# Altium footprint library SAMTEC THD.PcbLib: 161 footprints (part 9 of 12)
Each footprint in its own frame and in the unit in brackets; x right, y up, seen from the top. Pads: shape width x height; smd on the part's side, far side on the other; paste and mask are expansions set on the pad; w line width, h text height; cw(c..) or ccw(c..) is an arc to the next point about the centre after c.
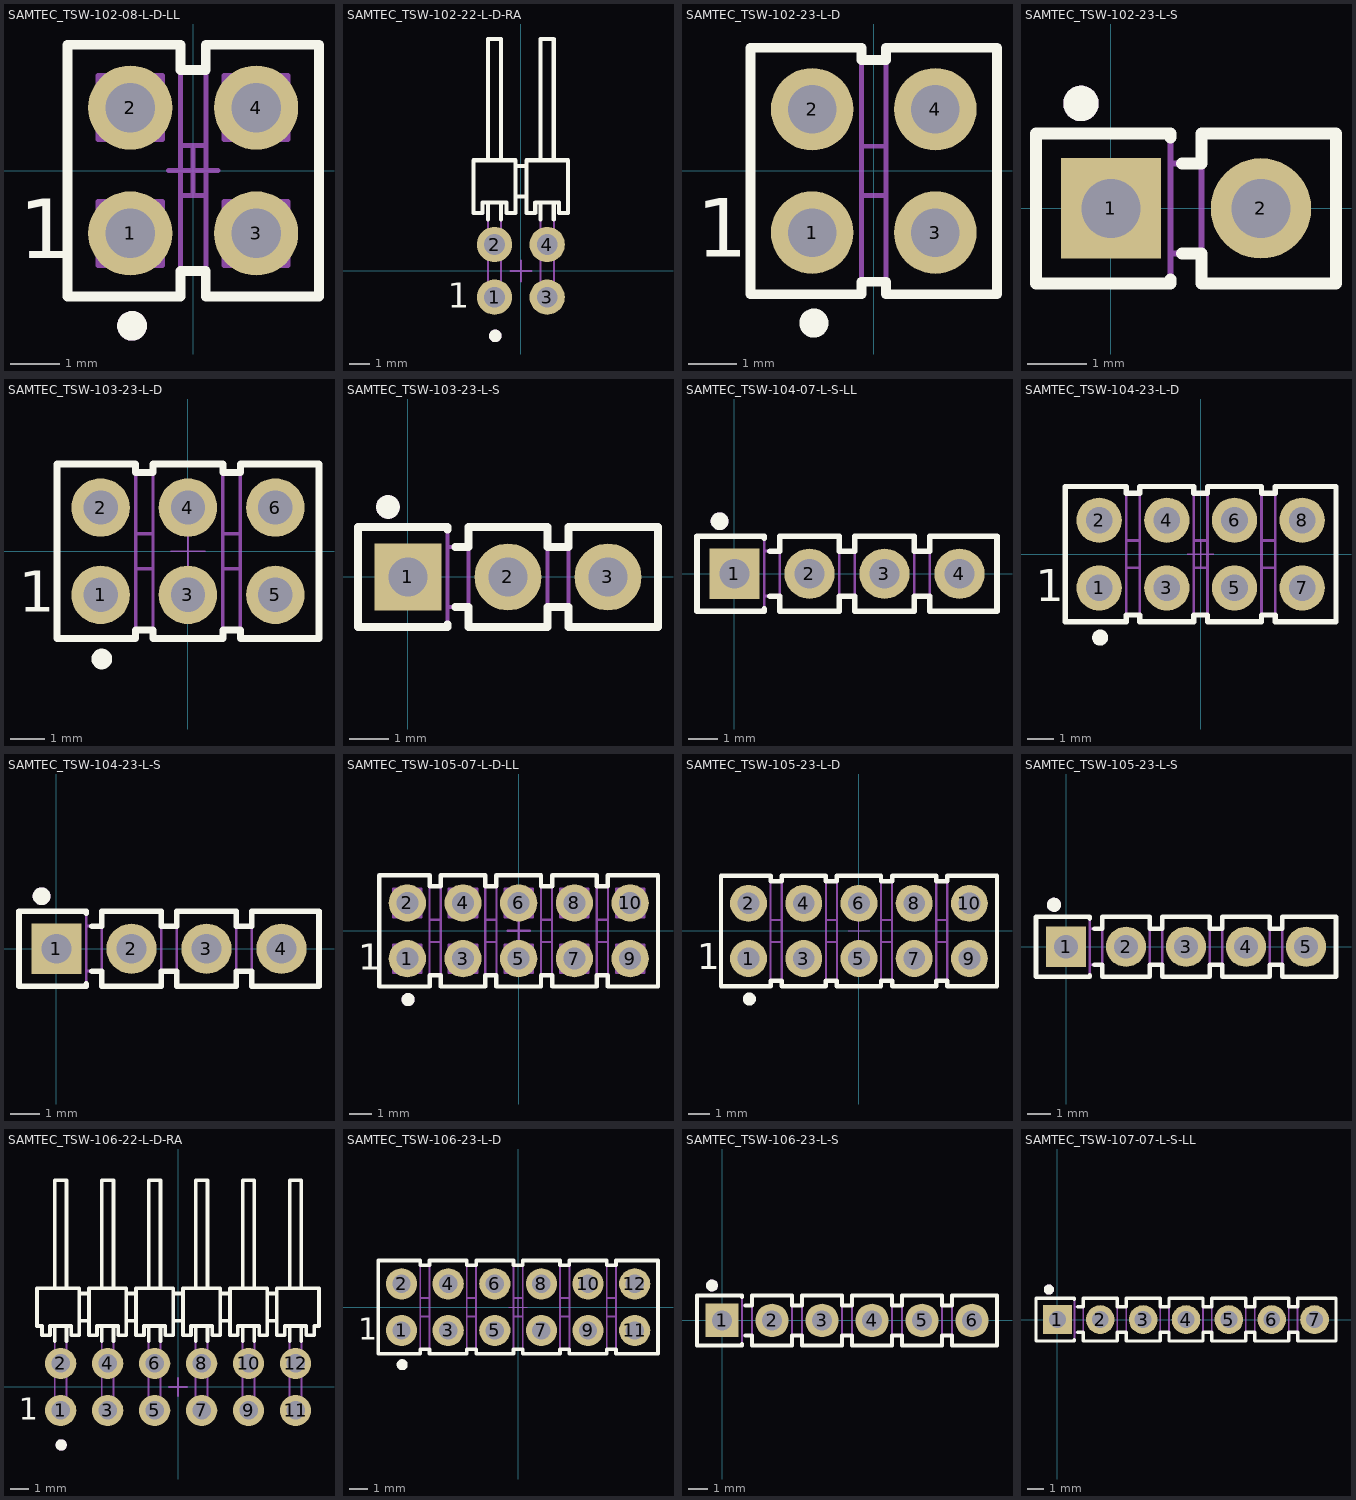
[diagram p8: the footprints below, top view; thin cyan lines are the x and y axes]

## SAMTEC_TSW-102-08-L-D-LL [mm] "4 Contacts, Pitch 2.54mm - Dual Row, Through Mount Straigh Header"
height 8.38
pads (4):
  round 1.7 hole 1: 1(-1.27,-1.27) 2(-1.27,1.27) 3(1.27,-1.27) 4(1.27,1.27)
Top Overlay:
  circle w0.3: c-1.235,-3.135 r0.15
  lines w0.2: 2.54,-2.54 2.54,2.54 ; 2.54,-2.54 0.254,-2.54 0.254,-2.032 -0.254,-2.032 -0.254,-2.54 -2.54,-2.54 -2.54,2.54 -0.254,2.54 -0.254,2.032 0.254,2.032 0.254,2.54 2.54,2.54 ; 2.54,-2.54 2.54,2.54
  text "1" at -3.517,-1.768 h1.2
Mechanical 8:
  lines w0.1: -1.77,-1.27 -1.27,-1.27 ; -1.77,1.27 -1.27,1.27 ; -1.27,-1.77 -1.27,-1.27 ; -1.27,-0.77 -1.27,-1.27 ; -1.27,0.77 -1.27,1.27 ; -1.27,1.77 -1.27,1.27 ; -0.77,-1.27 -1.27,-1.27 ; -0.77,1.27 -1.27,1.27 ; -0.5,0 0,0 ; 0,-0.5 0,0 ; 0,0.5 0,0 ; 0.5,0 0,0 ; 0.77,-1.27 1.27,-1.27 ; 0.77,1.27 1.27,1.27 ; 1.27,-1.77 1.27,-1.27 ; 1.27,-0.77 1.27,-1.27 ; 1.27,0.77 1.27,1.27 ; 1.27,1.77 1.27,1.27 ; 1.77,-1.27 1.27,-1.27 ; 1.77,1.27 1.27,1.27
Mechanical 14:
  circle w0.3: c-1.235,-3.135 r0.15
  lines w0.1: -0.254,-2.032 0.254,-2.032 ; -0.254,-0.508 0.254,-0.508 ; -0.254,0.508 0.254,0.508 ; -0.254,2.032 0.254,2.032 ; -2.54,-2.54 -0.254,-2.54 ; -2.54,-2.54 -2.54,2.54 ; -2.54,-2.54 -2.54,2.54 ; -2.54,2.54 -0.254,2.54 ; -1.918,-1.918 -0.622,-1.918 ; -1.918,-1.918 -1.918,-0.622 ; -1.918,-1.918 -1.587,-1.587 ; -1.918,-0.622 -0.622,-0.622 ; -1.918,-0.622 -1.587,-0.953 ; -1.918,0.622 -0.622,0.622 ; -1.918,0.622 -1.918,1.918 ; -1.918,0.622 -1.587,0.953 ; -1.918,1.918 -0.622,1.918 ; -1.918,1.918 -1.587,1.587 ; -1.587,-1.587 -0.953,-1.587 ; -1.587,-1.587 -1.587,-0.953 ; -1.587,-0.953 -0.953,-0.953 ; -1.587,0.953 -0.953,0.953 ; -1.587,0.953 -1.587,1.587 ; -1.587,1.587 -0.953,1.587 ; -0.953,-1.587 -0.953,-0.953 ; -0.953,-1.587 -0.622,-1.918 ; -0.953,-0.953 -0.622,-0.622 ; -0.953,0.953 -0.953,1.587 ; -0.953,0.953 -0.622,0.622 ; -0.953,1.587 -0.622,1.918 ; -0.622,-1.918 -0.622,-0.622 ; -0.622,0.622 -0.622,1.918 ; -0.254,-2.54 -0.254,2.54 ; -0.254,-2.54 -0.254,2.54 ; -0.254,-2.54 -0.254,2.54 ; 0.622,-1.918 1.918,-1.918 ; 0.622,-1.918 0.622,-0.622 ; 0.622,-1.918 0.953,-1.587 ; 0.622,-0.622 1.918,-0.622 ; 0.622,-0.622 0.953,-0.953 ; 0.622,0.622 1.918,0.622 ; 0.622,0.622 0.622,1.918 ; 0.622,0.622 0.953,0.953 ; 0.622,1.918 1.918,1.918 ; 0.622,1.918 0.953,1.587 ; 0.953,-1.587 1.587,-1.587 ; 0.953,-1.587 0.953,-0.953 ; 0.953,-0.953 1.587,-0.953 ; 0.953,0.953 1.587,0.953 ; 0.953,0.953 0.953,1.587 ; 0.953,1.587 1.587,1.587 ; 1.587,-1.587 1.587,-0.953 ; 1.587,-1.587 1.918,-1.918 ; 1.587,-0.953 1.918,-0.622 ; 1.587,0.953 1.587,1.587 ; 1.587,0.953 1.918,0.622 ; 1.587,1.587 1.918,1.918 ; 1.918,-1.918 1.918,-0.622 ; 1.918,0.622 1.918,1.918 ; 2.54,-2.54 2.54,2.54 ; 2.54,-2.54 0.254,-2.54 0.254,2.54 2.54,2.54 ; 2.54,-2.54 2.54,2.54
  text "1" at -3.517,-1.768 h1.2
3D body "SAMTEC_TSW-102-08-L-D-LL.stp": height 8.38, standoff -5.08, extent -2.54,-2.54 2.54,2.54

## SAMTEC_TSW-102-22-L-D-RA [mm] "4 Contacts - Pitch 2.54mm - Dual Row Through Mount  Right Angle Header (Post Lead 5.84mm, Tail Lead 4.84mm)"
height 5.56
pads (4):
  round 1.7 hole 1: 1(-1.27,-1.27) 2(-1.27,1.27) 3(1.27,-1.27) 4(1.27,1.27)
Top Overlay:
  circle w0.3: c-1.235,-3.135 r0.15
  lines w0.2: -1.587,2.479 -1.587,3.302 ; -1.587,5.334 -1.587,11.176 -0.952,11.176 -0.952,5.334 ; -0.952,2.479 -0.952,3.302 ; -0.264,3.581 0.264,3.581 ; -0.264,5.055 0.264,5.055 ; 0.953,2.479 0.953,3.302 ; 0.953,5.334 0.953,11.176 1.588,11.176 1.588,5.334 ; 1.588,2.479 1.588,3.302 ; -2.276,2.794 -1.844,2.794 -1.844,3.302 -0.696,3.302 -0.696,2.794 -0.264,2.794 -0.264,5.334 -2.276,5.334 -2.276,2.794 ; 0.264,2.794 0.696,2.794 0.696,3.302 1.844,3.302 1.844,2.794 2.276,2.794 2.276,5.334 0.264,5.334 0.264,2.794
  text "1" at -3.517,-1.768 h1.2
Mechanical 8:
  lines w0.1: -1.77,-1.27 -1.27,-1.27 ; -1.77,1.27 -1.27,1.27 ; -1.27,-1.77 -1.27,-1.27 ; -1.27,-0.77 -1.27,-1.27 ; -1.27,0.77 -1.27,1.27 ; -1.27,1.77 -1.27,1.27 ; -0.77,-1.27 -1.27,-1.27 ; -0.77,1.27 -1.27,1.27 ; -0.5,0 0,0 ; 0,-0.5 0,0 ; 0,0.5 0,0 ; 0.5,0 0,0 ; 0.77,-1.27 1.27,-1.27 ; 0.77,1.27 1.27,1.27 ; 1.27,-1.77 1.27,-1.27 ; 1.27,-0.77 1.27,-1.27 ; 1.27,0.77 1.27,1.27 ; 1.27,1.77 1.27,1.27 ; 1.77,-1.27 1.27,-1.27 ; 1.77,1.27 1.27,1.27
Mechanical 14:
  circle w0.3: c-1.235,-3.135 r0.15
  lines w0.1: -1.587,3.302 -1.587,-1.587 -0.952,-1.587 -0.952,3.302 ; -1.587,5.334 -1.587,11.176 -0.952,11.176 -0.952,5.334 ; -0.264,3.581 0.264,3.581 ; -0.264,5.055 0.264,5.055 ; 0.953,3.302 0.953,-1.587 1.588,-1.587 1.588,3.302 ; 0.953,5.334 0.953,11.176 1.588,11.176 1.588,5.334 ; -2.276,2.794 -1.844,2.794 -1.844,3.302 -0.696,3.302 -0.696,2.794 -0.264,2.794 -0.264,5.334 -2.276,5.334 -2.276,2.794 ; 0.264,2.794 0.696,2.794 0.696,3.302 1.844,3.302 1.844,2.794 2.276,2.794 2.276,5.334 0.264,5.334 0.264,2.794
  text "1" at -3.517,-1.768 h1.2
3D body "SAMTEC_TSW-102-22-L-D-RA.stp": height 5.59, standoff -4.83, extent -2.276,-1.587 2.276,11.176

## SAMTEC_TSW-102-23-L-D [mm] "4 Contacts - Pitch 2.54mm - Dual Row  Through Mount Straigh Header (Post Lead 5.84mm, Tail Lead 2.92mm, Insulator 2.54mm)"
height 8.38
pads (4):
  round 1.7 hole 1: 1(-1.27,-1.27) 2(-1.27,1.27) 3(1.27,-1.27) 4(1.27,1.27)
Top Overlay:
  circle w0.3: c-1.235,-3.135 r0.15
  lines w0.2: -2.54,-2.54 -2.54,2.54 -0.254,2.54 -0.254,2.286 0.254,2.286 0.254,2.54 2.54,2.54 2.54,-2.54 0.254,-2.54 0.254,-2.286 -0.254,-2.286 -0.254,-2.54 -2.54,-2.54
  text "1" at -3.642,-1.768 h1.2
Mechanical 8:
  lines w0.1: -1.77,-1.27 -1.27,-1.27 ; -1.77,1.27 -1.27,1.27 ; -1.27,-1.77 -1.27,-1.27 ; -1.27,-0.77 -1.27,-1.27 ; -1.27,0.77 -1.27,1.27 ; -1.27,1.77 -1.27,1.27 ; -0.77,-1.27 -1.27,-1.27 ; -0.77,1.27 -1.27,1.27 ; 0.77,-1.27 1.27,-1.27 ; 0.77,1.27 1.27,1.27 ; 1.27,-1.77 1.27,-1.27 ; 1.27,-0.77 1.27,-1.27 ; 1.27,0.77 1.27,1.27 ; 1.27,1.77 1.27,1.27 ; 1.77,-1.27 1.27,-1.27 ; 1.77,1.27 1.27,1.27
Mechanical 14:
  lines w0.1: -0.254,-2.286 0.254,-2.286 ; -0.254,-0.508 0.254,-0.508 ; -0.254,0.508 0.254,0.508 ; -0.254,2.286 0.254,2.286 ; -2.54,-2.54 -0.254,-2.54 -0.254,2.54 -2.54,2.54 -2.54,-2.54 ; -1.587,-1.588 -0.952,-1.588 -0.952,-0.953 -1.587,-0.953 -1.587,-1.588 ; -1.587,0.952 -0.952,0.952 -0.952,1.587 -1.587,1.587 -1.587,0.952 ; 0.254,-2.54 2.54,-2.54 2.54,2.54 0.254,2.54 0.254,-2.54 ; 0.953,-1.588 1.588,-1.588 1.588,-0.953 0.953,-0.953 0.953,-1.588 ; 0.953,0.952 1.588,0.952 1.588,1.587 0.953,1.587 0.953,0.952
3D body "SAMTEC_TSW-102-23-L-D.stp": height 8.38, standoff -2.92, extent -2.54,-2.54 2.54,2.54

## SAMTEC_TSW-102-23-L-S [mm] "2 Contacts - Pitch 2.54mm - Single Row  Through Mount Straigh Header (Post Lead 5.84mm, Tail Lead 2.92mm, Insulator 2.54mm)"
height 8.38
pads (2):
  rect 1.7x1.7 hole 1: 1(0,0)
  round 1.7 hole 1: 2(2.54,0)
Top Overlay:
  circle w0.3: c-0.508,1.778 r0.15
  lines w0.2: 1.007,-1.2 1.007,-1.27 -1.27,-1.27 -1.27,1.27 1.007,1.27 1.007,1.2 ; 1.2,-0.762 1.533,-0.762 1.533,-1.27 3.81,-1.27 3.81,1.27 1.533,1.27 1.533,0.762 1.2,0.762
Mechanical 8:
  lines w0.1: -0.5,0 0,0 ; 0,-0.5 0,0 ; 0,0.5 0,0 ; 0.5,0 0,0 ; 2.04,0 2.54,0 ; 2.54,-0.5 2.54,0 ; 2.54,0.5 2.54,0 ; 3.04,0 2.54,0
Mechanical 14:
  circle w0.3: c-0.508,1.778 r0.15
  lines w0.1: 1.007,-0.762 1.533,-0.762 ; 1.007,0.762 1.533,0.762 ; -1.27,-1.27 -1.27,1.27 1.007,1.27 1.007,-1.27 -1.27,-1.27 ; -0.317,-0.318 -0.317,0.317 0.317,0.317 0.318,-0.317 -0.317,-0.318 ; 1.533,-1.27 1.533,1.27 3.81,1.27 3.81,-1.27 1.533,-1.27 ; 2.223,-0.318 2.223,0.317 2.858,0.317 2.858,-0.318 2.223,-0.318
3D body "SAMTEC_TSW-102-23-L-S.stp": height 8.38, standoff -2.92, extent -1.27,-1.27 3.81,1.27

## SAMTEC_TSW-103-23-L-D [mm] "6 Contacts - Pitch 2.54mm - Dual Row  Through Mount Straigh Header (Post Lead 5.84mm, Tail Lead 2.92mm, Insulator 2.54mm)"
height 8.38
pads (6):
  round 1.7 hole 1: 1(-2.54,-1.27) 2(-2.54,1.27) 3(0,-1.27) 4(0,1.27) 5(2.54,-1.27) 6(2.54,1.27)
Top Overlay:
  circle w0.3: c-2.505,-3.135 r0.15
  lines w0.2: -3.81,-2.54 -1.524,-2.54 -1.524,-2.286 -1.016,-2.286 -1.016,-2.54 1.016,-2.54 1.016,-2.286 1.524,-2.286 1.524,-2.54 3.81,-2.54 3.81,2.54 1.524,2.54 1.524,2.286 1.016,2.286 1.016,2.54 -1.016,2.54 -1.016,2.286 -1.524,2.286 -1.524,2.54 -3.81,2.54 -3.81,-2.54
  text "1" at -4.912,-1.768 h1.2
Mechanical 8:
  lines w0.05: -3.04,-1.27 -2.54,-1.27 ; -3.04,1.27 -2.54,1.27 ; -2.54,-1.77 -2.54,-1.27 ; -2.54,-0.77 -2.54,-1.27 ; -2.54,0.77 -2.54,1.27 ; -2.54,1.77 -2.54,1.27 ; -2.04,-1.27 -2.54,-1.27 ; -2.04,1.27 -2.54,1.27 ; -0.5,-1.27 0,-1.27 ; -0.5,0 0,0 ; -0.5,1.27 0,1.27 ; 0,-1.77 0,-1.27 ; 0,-0.77 0,-1.27 ; 0,-0.5 0,0 ; 0,0.5 0,0 ; 0,0.77 0,1.27 ; 0,1.77 0,1.27 ; 0.5,-1.27 0,-1.27 ; 0.5,0 0,0 ; 0.5,1.27 0,1.27 ; 2.04,-1.27 2.54,-1.27 ; 2.04,1.27 2.54,1.27 ; 2.54,-1.77 2.54,-1.27 ; 2.54,-0.77 2.54,-1.27 ; 2.54,0.77 2.54,1.27 ; 2.54,1.77 2.54,1.27 ; 3.04,-1.27 2.54,-1.27 ; 3.04,1.27 2.54,1.27
Mechanical 14:
  lines w0.1: -1.524,-2.286 -1.016,-2.286 ; -1.524,-0.508 -1.016,-0.508 ; -1.524,0.508 -1.016,0.508 ; -1.524,2.286 -1.016,2.286 ; 1.016,-2.286 1.524,-2.286 ; 1.016,-0.508 1.524,-0.508 ; 1.016,0.508 1.524,0.508 ; 1.016,2.286 1.524,2.286 ; -3.81,-2.54 -3.81,2.54 -1.524,2.54 -1.524,-2.54 -3.81,-2.54 ; -1.016,-2.54 -1.016,2.54 1.016,2.54 1.016,-2.54 -1.016,-2.54 ; 1.524,-2.54 1.524,2.54 3.81,2.54 3.81,-2.54 1.524,-2.54
3D body "SAMTEC_TSW-103-23-L-D.stp": height 8.38, standoff -2.92, extent -3.81,-2.54 3.81,2.54

## SAMTEC_TSW-103-23-L-S [mm] "3 Contacts - Pitch 2.54mm - Single Row  Through Mount Straigh Header (Post Lead 5.84mm, Tail Lead 2.92mm, Insulator 2.54mm)"
height 8.38
pads (3):
  rect 1.7x1.7 hole 1: 1(0,0)
  round 1.7 hole 1: 2(2.54,0) 3(5.08,0)
Top Overlay:
  circle w0.3: c-0.508,1.778 r0.15
  lines w0.2: 1.007,-1.2 1.007,-1.27 -1.27,-1.27 -1.27,1.27 1.007,1.27 1.007,1.2 ; 1.2,-0.762 1.533,-0.762 1.533,-1.27 3.547,-1.27 3.547,-0.762 4.073,-0.762 4.073,-1.27 6.35,-1.27 6.35,1.27 4.073,1.27 4.073,0.762 3.547,0.762 3.547,1.27 1.533,1.27 1.533,0.762 1.2,0.762
Mechanical 8:
  lines w0.1: -0.5,0 0,0 ; 0,-0.5 0,0 ; 0,0.5 0,0 ; 0.5,0 0,0 ; 2.04,0 2.54,0 ; 2.54,-0.5 2.54,0 ; 2.54,0.5 2.54,0 ; 3.04,0 2.54,0 ; 4.58,0 5.08,0 ; 5.08,-0.5 5.08,0 ; 5.08,0.5 5.08,0 ; 5.58,0 5.08,0
Mechanical 14:
  circle w0.3: c-0.508,1.778 r0.15
  lines w0.1: 1.007,-0.762 1.533,-0.762 ; 1.007,0.762 1.533,0.762 ; 3.547,-0.762 4.073,-0.762 ; 3.547,0.762 4.073,0.762 ; -1.27,-1.27 -1.27,1.27 1.007,1.27 1.007,-1.27 -1.27,-1.27 ; -0.317,-0.318 -0.317,0.317 0.317,0.317 0.318,-0.317 -0.317,-0.318 ; 1.533,-1.27 3.547,-1.27 3.547,1.27 1.533,1.27 1.533,-1.27 ; 2.223,-0.318 2.223,0.317 2.857,0.317 2.858,-0.317 2.223,-0.318 ; 4.073,-1.27 4.073,1.27 6.35,1.27 6.35,-1.27 4.073,-1.27 ; 4.763,-0.318 4.763,0.317 5.398,0.317 5.398,-0.318 4.763,-0.318
3D body "SAMTEC_TSW-103-23-L-S.stp": height 8.38, standoff -2.92, extent -1.27,-1.27 6.35,1.27

## SAMTEC_TSW-104-07-L-S-LL [mm] "4 Contacts - Pitch 2.54mm - Single Row  Through Mount Straigh Header (Post Lead 5.84mm, Tail Lead 2.54mm, Insulator 2.54mm)"
height 8.38
pads (4):
  rect 1.7x1.7 hole 1: 1(0,0)
  round 1.7 hole 1: 2(2.54,0) 3(5.08,0) 4(7.62,0)
Top Overlay:
  circle w0.3: c-0.508,1.778 r0.15
  lines w0.2: 1.007,-1.2 1.007,-1.27 -1.27,-1.27 -1.27,1.27 1.007,1.27 1.007,1.2 ; 1.2,-0.762 1.533,-0.762 1.533,-1.27 3.547,-1.27 3.547,-0.762 4.073,-0.762 4.073,-1.27 6.087,-1.27 6.087,-0.762 ; 1.2,0.762 1.533,0.762 1.533,1.27 3.547,1.27 3.547,0.762 4.073,0.762 4.073,1.27 6.087,1.27 6.087,0.762 ; 6.087,-0.762 6.613,-0.762 ; 6.087,-0.762 6.613,-0.762 ; 6.087,0.762 6.613,0.762 ; 6.087,0.762 6.613,0.762 ; 6.613,-0.762 6.613,-1.27 8.89,-1.27 8.89,1.27 6.613,1.27 6.613,0.762
Mechanical 8:
  lines w0.1: -0.5,0 0,0 ; 0,-0.5 0,0 ; 0,0.5 0,0 ; 0.5,0 0,0 ; 2.04,0 2.54,0 ; 2.54,-0.5 2.54,0 ; 2.54,0.5 2.54,0 ; 3.04,0 2.54,0 ; 4.58,0 5.08,0 ; 5.08,-0.5 5.08,0 ; 5.08,0.5 5.08,0 ; 5.58,0 5.08,0 ; 7.12,0 7.62,0 ; 7.62,-0.5 7.62,0 ; 7.62,0.5 7.62,0 ; 8.12,0 7.62,0
Mechanical 14:
  circle w0.3: c-0.508,1.778 r0.15
  lines w0.1: 1.007,-0.762 1.533,-0.762 ; 1.007,0.762 1.533,0.762 ; 3.547,-0.762 4.073,-0.762 ; 3.547,0.762 4.073,0.762 ; -1.27,-1.27 -1.27,1.27 1.007,1.27 1.007,-1.27 -1.27,-1.27 ; -0.317,-0.318 -0.318,0.317 0.317,0.317 0.318,-0.317 -0.317,-0.318 ; 1.533,-1.27 3.547,-1.27 3.547,1.27 1.533,1.27 1.533,-1.27 ; 2.223,-0.318 2.222,0.317 2.857,0.317 2.858,-0.317 2.223,-0.318 ; 4.073,-1.27 4.073,1.27 6.087,1.27 6.087,-1.27 4.073,-1.27 ; 4.763,-0.318 5.398,-0.318 5.397,0.317 4.763,0.317 4.763,-0.318 ; 6.087,-0.762 6.613,-0.762 6.087,-0.762 ; 6.087,0.762 6.613,0.762 6.087,0.762 ; 6.613,-1.27 6.613,1.27 8.89,1.27 8.89,-1.27 6.613,-1.27 ; 7.303,-0.318 7.303,0.317 7.938,0.317 7.938,-0.318 7.303,-0.318
3D body "SAMTEC_TSW-104-07-L-S-LL.stp": height 8.38, standoff -2.54, extent -1.27,-1.27 8.89,1.27

## SAMTEC_TSW-104-23-L-D [mm] "8 Contacts - Pitch 2.54mm - Dual Row  Through Mount Straigh Header (Post Lead 5.84mm, Tail Lead 2.92mm, Insulator 2.54mm)"
height 8.38
pads (8):
  round 1.7 hole 1: 1(-3.81,-1.27) 2(-3.81,1.27) 3(-1.27,-1.27) 4(-1.27,1.27) 5(1.27,-1.27) 6(1.27,1.27) 7(3.81,-1.27) 8(3.81,1.27)
Top Overlay:
  circle w0.3: c-3.775,-3.135 r0.15
  lines w0.2: -5.08,-2.54 -2.794,-2.54 -2.794,-2.286 -2.286,-2.286 -2.286,-2.54 -0.254,-2.54 -0.254,-2.286 0.254,-2.286 0.254,-2.54 2.286,-2.54 2.286,-2.286 2.794,-2.286 2.794,-2.54 5.08,-2.54 5.08,2.54 2.794,2.54 2.794,2.286 2.286,2.286 2.286,2.54 0.254,2.54 0.254,2.286 -0.254,2.286 -0.254,2.54 -2.286,2.54 -2.286,2.286 -2.794,2.286 -2.794,2.54 -5.08,2.54 -5.08,-2.54
  text "1" at -6.182,-1.768 h1.2
Mechanical 8:
  lines w0.05: -4.31,-1.27 -3.81,-1.27 ; -4.31,1.27 -3.81,1.27 ; -3.81,-1.77 -3.81,-1.27 ; -3.81,-0.77 -3.81,-1.27 ; -3.81,0.77 -3.81,1.27 ; -3.81,1.77 -3.81,1.27 ; -3.31,-1.27 -3.81,-1.27 ; -3.31,1.27 -3.81,1.27 ; -1.77,-1.27 -1.27,-1.27 ; -1.77,1.27 -1.27,1.27 ; -1.27,-1.77 -1.27,-1.27 ; -1.27,-0.77 -1.27,-1.27 ; -1.27,0.77 -1.27,1.27 ; -1.27,1.77 -1.27,1.27 ; -0.77,-1.27 -1.27,-1.27 ; -0.77,1.27 -1.27,1.27 ; -0.5,0 0,0 ; 0,-0.5 0,0 ; 0,0.5 0,0 ; 0.5,0 0,0 ; 0.77,-1.27 1.27,-1.27 ; 0.77,1.27 1.27,1.27 ; 1.27,-1.77 1.27,-1.27 ; 1.27,-0.77 1.27,-1.27 ; 1.27,0.77 1.27,1.27 ; 1.27,1.77 1.27,1.27 ; 1.77,-1.27 1.27,-1.27 ; 1.77,1.27 1.27,1.27 ; 3.31,-1.27 3.81,-1.27 ; 3.31,1.27 3.81,1.27 ; 3.81,-1.77 3.81,-1.27 ; 3.81,-0.77 3.81,-1.27 ; 3.81,0.77 3.81,1.27 ; 3.81,1.77 3.81,1.27 ; 4.31,-1.27 3.81,-1.27 ; 4.31,1.27 3.81,1.27
Mechanical 14:
  lines w0.1: -2.794,-2.286 -2.286,-2.286 ; -2.794,-0.508 -2.286,-0.508 ; -2.794,0.508 -2.286,0.508 ; -2.794,2.286 -2.286,2.286 ; -0.254,-2.286 0.254,-2.286 ; -0.254,-0.508 0.254,-0.508 ; -0.254,0.508 0.254,0.508 ; -0.254,2.286 0.254,2.286 ; 2.286,-2.286 2.794,-2.286 ; 2.286,-0.508 2.794,-0.508 ; 2.286,0.508 2.794,0.508 ; 2.286,2.286 2.794,2.286 ; -5.08,-2.54 -5.08,2.54 -2.794,2.54 -2.794,-2.54 -5.08,-2.54 ; -2.286,-2.54 -2.286,2.54 -0.254,2.54 -0.254,-2.54 -2.286,-2.54 ; 0.254,-2.54 0.254,2.54 2.286,2.54 2.286,-2.54 0.254,-2.54 ; 2.794,-2.54 2.794,2.54 5.08,2.54 5.08,-2.54 2.794,-2.54
3D body "SAMTEC_TSW-104-23-L-D.stp": height 8.38, standoff -2.92, extent -5.08,-2.54 5.08,2.54

## SAMTEC_TSW-104-23-L-S [mm] "4 Contacts - Pitch 2.54mm - Single Row  Through Mount Straigh Header (Post Lead 5.84mm, Tail Lead 2.92mm, Insulator 2.54mm)"
height 8.38
pads (4):
  rect 1.7x1.7 hole 1: 1(0,0)
  round 1.7 hole 1: 2(2.54,0) 3(5.08,0) 4(7.62,0)
Top Overlay:
  circle w0.3: c-0.508,1.778 r0.15
  lines w0.2: 1.007,-1.2 1.007,-1.27 -1.27,-1.27 -1.27,1.27 1.007,1.27 1.007,1.2 ; 1.2,-0.762 1.533,-0.762 1.533,-1.27 3.547,-1.27 3.547,-0.762 4.073,-0.762 4.073,-1.27 6.087,-1.27 6.087,-0.762 ; 1.2,0.762 1.533,0.762 1.533,1.27 3.547,1.27 3.547,0.762 4.073,0.762 4.073,1.27 6.087,1.27 6.087,0.762 ; 6.087,-0.762 6.613,-0.762 ; 6.087,-0.762 6.613,-0.762 ; 6.087,0.762 6.613,0.762 ; 6.087,0.762 6.613,0.762 ; 6.613,-0.762 6.613,-1.27 8.89,-1.27 8.89,1.27 6.613,1.27 6.613,0.762
Mechanical 8:
  lines w0.1: -0.5,0 0,0 ; 0,-0.5 0,0 ; 0,0.5 0,0 ; 0.5,0 0,0 ; 2.04,0 2.54,0 ; 2.54,-0.5 2.54,0 ; 2.54,0.5 2.54,0 ; 3.04,0 2.54,0 ; 4.58,0 5.08,0 ; 5.08,-0.5 5.08,0 ; 5.08,0.5 5.08,0 ; 5.58,0 5.08,0 ; 7.12,0 7.62,0 ; 7.62,-0.5 7.62,0 ; 7.62,0.5 7.62,0 ; 8.12,0 7.62,0
Mechanical 14:
  circle w0.3: c-0.508,1.778 r0.15
  lines w0.1: 1.007,-0.762 1.533,-0.762 ; 1.007,0.762 1.533,0.762 ; 3.547,-0.762 4.073,-0.762 ; 3.547,0.762 4.073,0.762 ; -1.27,-1.27 1.007,-1.27 1.007,1.27 -1.27,1.27 -1.27,-1.27 ; -0.317,-0.318 0.318,-0.318 0.317,0.317 -0.318,0.317 -0.317,-0.318 ; 1.533,-1.27 1.533,1.27 3.547,1.27 3.547,-1.27 1.533,-1.27 ; 2.223,-0.318 2.858,-0.318 2.857,0.317 2.222,0.317 2.223,-0.318 ; 4.073,-1.27 6.087,-1.27 6.087,1.27 4.073,1.27 4.073,-1.27 ; 4.763,-0.318 5.398,-0.318 5.397,0.317 4.763,0.317 4.763,-0.318 ; 6.087,-0.762 6.613,-0.762 6.087,-0.762 ; 6.087,0.762 6.613,0.762 6.087,0.762 ; 6.613,-1.27 8.89,-1.27 8.89,1.27 6.613,1.27 6.613,-1.27 ; 7.303,-0.318 7.938,-0.318 7.938,0.317 7.303,0.317 7.303,-0.318
3D body "SAMTEC_TSW-104-23-L-S.stp": height 8.38, standoff -2.92, extent -1.27,-1.27 8.89,1.27
